# Altium footprint library CeleronLib_SMD.PcbLib: 198 footprints (part 6 of 13)
Each footprint in its own frame and in the unit in brackets; x right, y up, seen from the top. Pads: shape width x height; smd on the part's side, far side on the other; paste and mask are expansions set on the pad; w line width, h text height; cw(c..) or ccw(c..) is an arc to the next point about the centre after c.
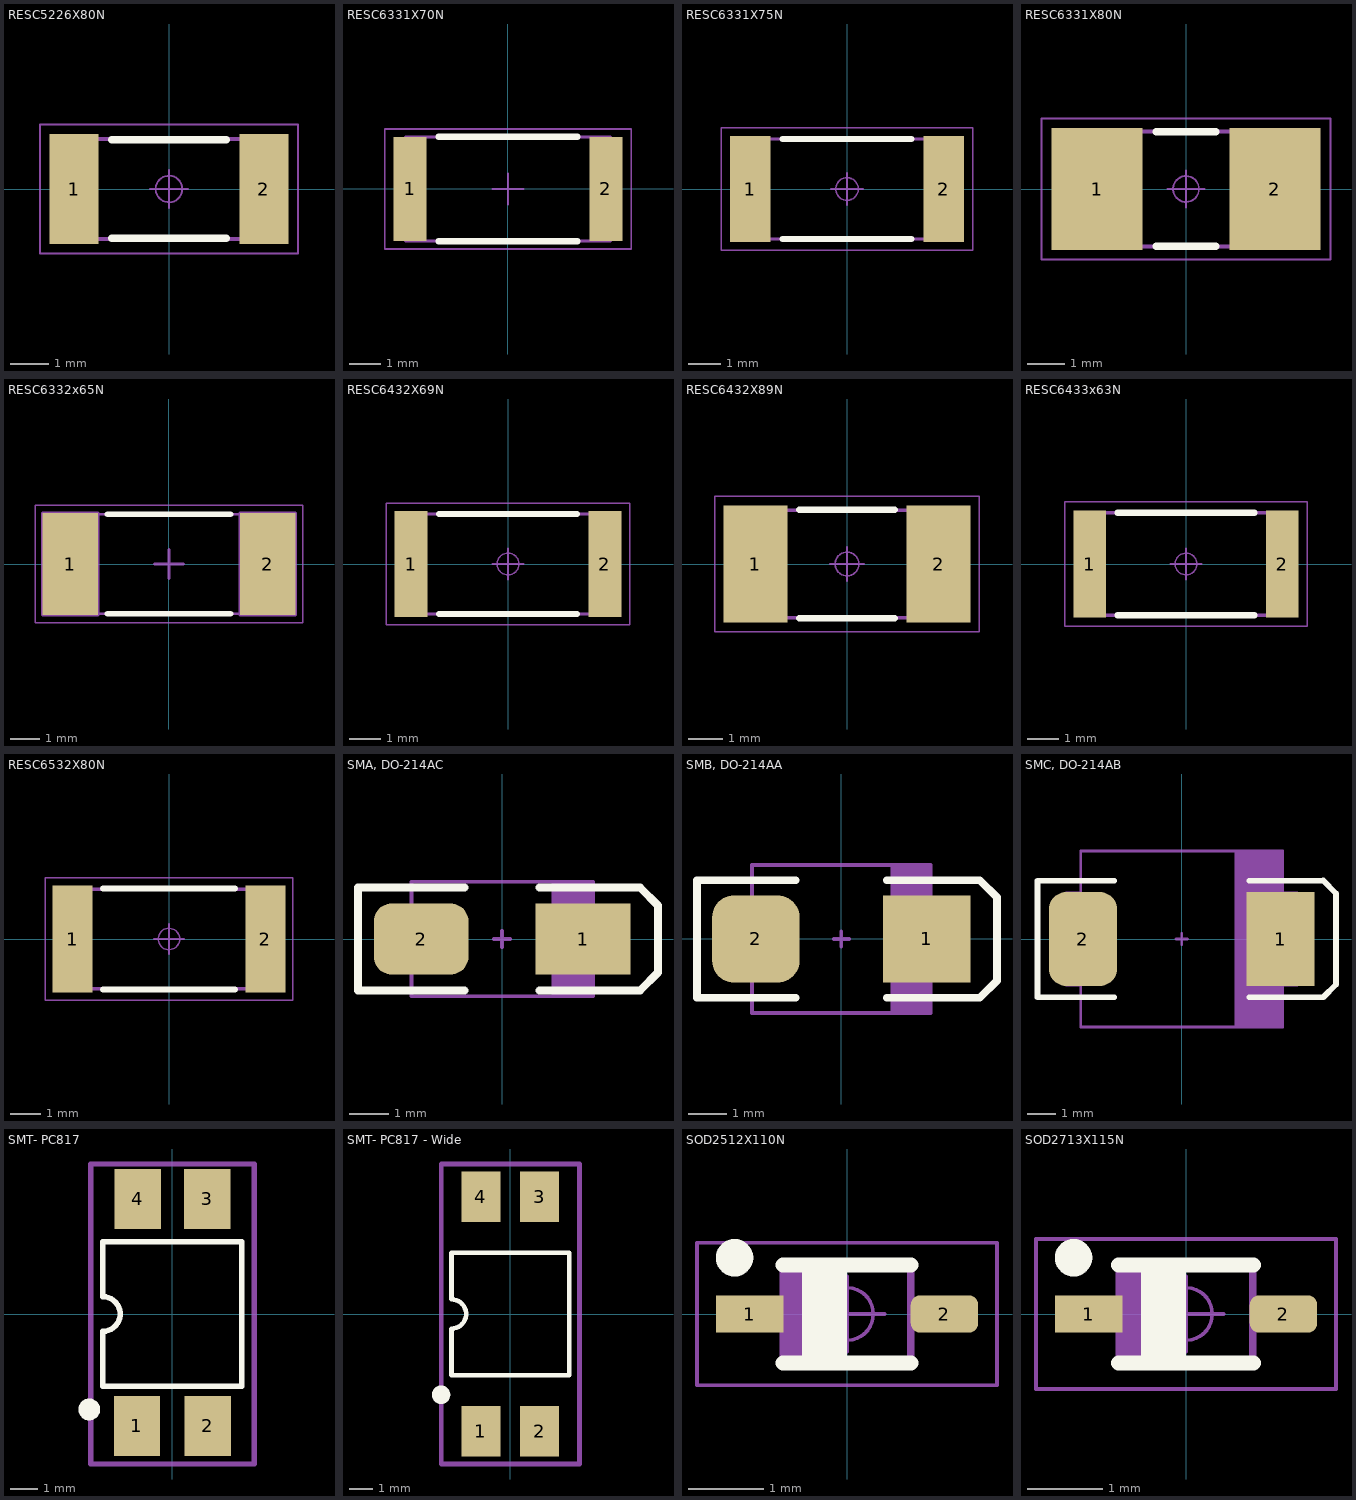
[diagram p5: the footprints below, top view; thin cyan lines are the x and y axes]

## RESC5226X80N [mm] "Resistor, Chip; 5.23mm L X 2.64mm W X 0.80mm H IPC Medium Density"
height 0.8
pads (2):
  rect 1.3x2.9 smd: 1(-2.5,0) 2(2.5,0)
Top Overlay:
  lines w0.2: -1.5,-1.3 1.5,-1.3 ; -1.5,1.3 1.5,1.3
Top Assy:
  lines w0.1: -2.615,-1.32 2.615,-1.32 2.615,1.32 -2.615,1.32 -2.615,-1.32
Top Courtyard:
  circle w0.05: c0,0 r0.35
  lines w0.05: -0.5,0 0.5,0 ; 0,-0.5 0,0.5 ; -3.4,-1.7 3.4,-1.7 3.4,1.7 -3.4,1.7 -3.4,-1.7
3D body: height 0.8, standoff 0, extent -2.615,-1.32 2.615,1.32

## RESC6331X70N [mm] "Chip Resistor, EIA 2512, Metric 6331, 2-Leads, Body 6.3x3.1mm, IPC Medium Density"
height 0.7
pads (2):
  rect 1.05x3.3 smd: 1(-3.1,0) 2(3.1,0)
Top Overlay:
  lines w0.2: -2.2,-1.65 2.2,-1.65 ; -2.2,1.65 2.2,1.65
Top Assy:
  lines w0.1: -3.25,-1.65 -3.25,1.65 3.25,1.65 3.25,-1.65 -3.25,-1.65
Top Courtyard:
  lines w0.05: -0.5,0 0.5,0 ; 0,-0.5 0,0.5 ; -3.9,-1.9 -3.9,1.9 3.9,1.9 3.9,-1.9 -3.9,-1.9
3D body: height 0.7, standoff 0, extent -3.25,-1.65 3.25,1.65

## RESC6331X75N [mm] "Chip Resistor, EIA 2512, Metric 6331, 2-Leads, Body 6.3x3.1mm, IPC Medium Density"
height 0.75
pads (2):
  rect 1.25x3.3 smd: 1(-3,0) 2(3,0)
Top Overlay:
  lines w0.2: -2,-1.55 2,-1.55 ; -2,1.55 2,1.55
Top Assy:
  lines w0.1: -3.15,-1.55 -3.15,1.55 3.15,1.55 3.15,-1.55 -3.15,-1.55
Top Courtyard:
  circle w0.05: c0,0 r0.35
  lines w0.05: -0.5,0 0.5,0 ; 0,-0.5 0,0.5 ; -3.9,-1.9 -3.9,1.9 3.9,1.9 3.9,-1.9 -3.9,-1.9
3D body: height 0.75, standoff 0, extent -3.25,-1.625 3.25,1.625

## RESC6331X80N [mm] "Chip Resistor, EIA 2512, Metric 6331, 2-Leads, Body 6.3x3.1mm, IPC Medium Density"
height 0.8
pads (2):
  rect 2.45x3.3 smd: 1(-2.4,0) 2(2.4,0)
Top Overlay:
  lines w0.2: -0.8,-1.55 0.8,-1.55 ; -0.8,1.55 0.8,1.55
Top Assy:
  lines w0.1: -3.15,-1.55 3.15,-1.55 3.15,1.55 -3.15,1.55 -3.15,-1.55
Top Courtyard:
  circle w0.05: c0,0 r0.35
  lines w0.05: -0.5,0 0.5,0 ; 0,-0.5 0,0.5 ; -3.9,-1.9 3.9,-1.9 3.9,1.9 -3.9,1.9 -3.9,-1.9
3D body: height 0.8, standoff 0, extent -3.25,-1.65 3.25,1.65

## RESC6332x65N [mm] "Chip Resistor, EIA 2512, Metric 6332, 2-Leads, Body 6.3x3.2mm, 3521 Serie"
height 0.65
pads (2):
  rect 1.9x3.5 smd: 1(-3.378,0) 2(3.378,0)
Top Overlay:
  lines w0.2: -2.1,-1.7 2.1,-1.7 ; -2.1,1.7 2.1,1.7
Mechanical 8:
  lines w0.1: -3.878,0 -3.378,0 ; -3.378,-0.5 -3.378,0 ; -3.378,0.5 -3.378,0 ; -2.878,0 -3.378,0 ; -0.5,0 0,0 ; 0,-0.5 0,0 ; 0,0.5 0,0 ; 0.5,0 0,0 ; 2.878,0 3.378,0 ; 3.378,-0.5 3.378,0 ; 3.378,0.5 3.378,0 ; 3.878,0 3.378,0 ; -4.328,-1.75 -4.328,1.75 -2.428,1.75 -2.428,-1.75 -4.328,-1.75 ; 2.428,-1.75 2.428,1.75 4.328,1.75 4.328,-1.75 2.428,-1.75
Top Assy:
  lines w0.1: -2.45,-1.7 -2.45,1.7 ; -2.1,-1.7 2.1,-1.7 ; 2.45,-1.7 2.45,1.7 ; -3.25,-1.7 -3.25,1.7 3.25,1.7 3.25,-1.7 -3.25,-1.7
Top Courtyard:
  lines w0.05: -4.578,-2 -4.578,2 4.578,2 4.578,-2 -4.578,-2
3D body: height 0.65, standoff 0, extent -3.25,-1.7 3.25,1.7

## RESC6432X69N [mm] "EIA 2512, Metric 6432, 2-Leads, Resistor, Chip; 6.35mm L X 3.20mm W X 0.69mm H, IPC Medium Density"
height 0.69
pads (2):
  rect 1.05x3.4 smd: 1(-3.1,0) 2(3.1,0)
Top Overlay:
  lines w0.2: -2.2,-1.6 2.2,-1.6 ; -2.2,1.6 2.2,1.6
Top Assy:
  lines w0.1: -3.175,-1.6 3.175,-1.6 3.175,1.6 -3.175,1.6 -3.175,-1.6
Top Courtyard:
  circle w0.05: c0,0 r0.35
  lines w0.05: -0.5,0 0.5,0 ; 0,-0.5 0,0.5 ; -3.9,-1.95 3.9,-1.95 3.9,1.95 -3.9,1.95 -3.9,-1.95
3D body: height 0.7, standoff 0, extent -3.25,-1.675 3.25,1.675

## RESC6432X89N [mm] "Resistor, Chip; 6.35mm L X 3.18mm W X 0.889mm H, IPC Medium Density"
height 0.89
pads (2):
  rect 1.9x3.45 smd: 1(-2.7,0) 2(2.7,0)
Top Overlay:
  lines w0.2: -1.4,-1.6 1.4,-1.6 ; -1.4,1.6 1.4,1.6
Top Assy:
  lines w0.1: -3.175,-1.59 3.175,-1.59 3.175,1.59 -3.175,1.59 -3.175,-1.59
Top Courtyard:
  circle w0.05: c0,0 r0.35
  lines w0.05: -0.5,0 0.5,0 ; 0,-0.5 0,0.5 ; -3.9,-2 3.9,-2 3.9,2 -3.9,2 -3.9,-2
3D body: height 0.89, standoff 0, extent -3.3,-1.715 3.3,1.715

## RESC6433x63N [mm] "EIA 2512, Metric 6433, Resistor, Chip; 6.35mm L X 3.30mm W X 0.627mm H, IPC Medium Density"
height 0.627
pads (2):
  rect 1.05x3.45 smd: 1(-3.1,0) 2(3.1,0)
Top Overlay:
  lines w0.2: -2.2,-1.65 2.2,-1.65 ; -2.2,1.65 2.2,1.65
Top Assy:
  lines w0.1: -3.175,-1.65 -3.175,1.65 3.175,1.65 3.175,-1.65 -3.175,-1.65
Top Courtyard:
  circle w0.05: c0,0 r0.35
  lines w0.05: -0.5,0 0.5,0 ; 0,-0.5 0,0.5 ; -3.9,-2 -3.9,2 3.9,2 3.9,-2 -3.9,-2
3D body: height 0.63, standoff 0, extent -3.175,-1.65 3.175,1.65

## RESC6532X80N [mm] "Resistor, Chip; 6.5mm L X 3.25mm W X 0.80mm H, IPC Medium Density"
height 0.8
pads (2):
  rect 1.3x3.5 smd: 1(-3.15,0) 2(3.15,0)
Top Overlay:
  lines w0.2: -2.15,-1.65 2.15,-1.65 ; -2.15,1.65 2.15,1.65
Top Assy:
  lines w0.1: -3.25,-1.625 -3.25,1.625 3.25,1.625 3.25,-1.625 -3.25,-1.625
Top Courtyard:
  circle w0.05: c0,0 r0.35
  lines w0.05: -0.5,0 0.5,0 ; 0,-0.5 0,0.5 ; -4.05,-2 -4.05,2 4.05,2 4.05,-2 -4.05,-2
3D body: height 0.8, standoff 0, extent -3.25,-1.625 3.25,1.625

## SMA, DO-214AC [mm] "DO-214-AC/SMA; 2 C-Bend Leads; Body 5 x 2.7 mm, inc. leads (LxW)"
height 2.44
pads (2):
  rect 2.4x1.8 smd: 1(2.05,0)
  rrect50% 2.4x1.8 smd: 2(-2.05,0)
Top Overlay:
  lines w0.2: -0.95,-1.3 -3.65,-1.3 -3.65,1.3 -0.95,1.3 ; 0.95,-1.3 3.5,-1.3 3.95,-0.85 3.95,0.85 3.5,1.3 0.95,1.3
Remarks:
  lines w0.1: -0.2,0 0.2,0 ; 0,-0.2 0,0.2
Top 3D:
  lines w0.1: -2.3,-0.8 -2.6,-0.8 -2.6,0.8 -2.3,0.8 ; 1.3,-1.45 1.3,1.45 ; 2.3,-0.8 2.6,-0.8 2.6,0.8 2.3,0.8 ; -2.3,-1.45 -2.3,1.45 2.3,1.45 2.3,-1.45 -2.3,-1.45
Top Assy:
  rectangle: 1.3,-1.45 2.3,1.45
  lines w0.1: 1.3,-1.45 1.3,1.45 ; -2.3,-1.45 2.3,-1.45 2.3,1.45 -2.3,1.45 -2.3,-1.45
3D body: height 1.22, standoff 0, extent -2.599,-0.799 -2.301,0.799
3D body: height 2.44, standoff 0, extent -2.299,-1.449 1.299,1.449
3D body: height 2.4, standoff 0, extent 1.301,-1.449 2.299,1.449
3D body: height 1.22, standoff 0, extent 2.301,-0.799 2.599,0.799
3D body: height 2.44, standoff 2.4, extent 1.301,-1.449 2.299,1.449

## SMB, DO-214AA [mm] "DO-214-AA/SMB; 2 C-Bend Leads; Body 5.3 x 3.6 mm, inc. leads (LxW)"
height 2.44
pads (2):
  rect 2.3x2.3 smd: 1(2.25,0)
  rrect50% 2.3x2.3 smd: 2(-2.25,0)
Top Overlay:
  lines w0.2: -1.2,-1.55 -3.8,-1.55 -3.8,1.55 -1.2,1.55 ; 1.2,-1.55 3.65,-1.55 4.1,-1.1 4.1,1.1 3.65,1.55 1.2,1.55
Remarks:
  lines w0.1: -0.2,0 0.2,0 ; 0,-0.2 0,0.2
Top 3D:
  lines w0.1: -2.35,-1.05 -2.8,-1.05 -2.8,1.05 -2.35,1.05 ; 1.35,-1.95 1.35,1.95 ; 2.35,-1.05 2.8,-1.05 2.8,1.05 2.35,1.05 ; -2.35,-1.95 -2.35,1.95 2.35,1.95 2.35,-1.95 -2.35,-1.95
Top Assy:
  rectangle: 1.35,-1.95 2.35,1.95
  lines w0.1: 1.35,-1.95 1.35,1.95 ; -2.35,-1.95 2.35,-1.95 2.35,1.95 -2.35,1.95 -2.35,-1.95
3D body: height 1.22, standoff 0, extent -2.8,-1.049 -2.351,1.049
3D body: height 2.44, standoff 0, extent -2.349,-1.949 1.349,1.949
3D body: height 2.4, standoff 0, extent 1.351,-1.949 2.349,1.949
3D body: height 1.22, standoff 0, extent 2.351,-1.049 2.8,1.049
3D body: height 2.44, standoff 2.4, extent 1.351,-1.949 2.349,1.949

## SMC, DO-214AB [mm] "DO-214-AB/SMC; 2 C-Bend Leads; Body 7.9 x 5.9 mm, inc. leads (LxW)"
height 2.62
pads (2):
  rect 2.4x3.3 smd: 1(3.475,0)
  rrect50% 2.4x3.3 smd: 2(-3.475,0)
Top Overlay:
  lines w0.2: -2.375,-2.05 -5.075,-2.05 -5.075,2.05 -2.375,2.05 ; 2.375,-2.05 4.975,-2.05 5.425,-1.6 5.425,1.6 4.975,2.055 ; 2.375,2.05 4.975,2.05
Remarks:
  lines w0.1: -0.2,0 0.2,0 ; 0,-0.2 0,0.2
Top 3D:
  lines w0.1: -3.55,-1.625 -4.05,-1.625 -4.05,1.625 -3.55,1.625 ; 1.9,-3.1 1.9,3.1 ; 3.55,-1.625 4.05,-1.625 4.05,1.625 3.55,1.625 ; -3.55,-3.1 3.55,-3.1 3.55,3.1 -3.55,3.1 -3.55,-3.1
Top Assy:
  rectangle: 1.9,-3.1 3.55,3.1
  lines w0.1: 1.9,-3.1 1.9,3.1 ; -3.55,-3.1 -3.55,3.1 3.55,3.1 3.55,-3.1 -3.55,-3.1
3D body: height 2.62, standoff 2.6, extent 1.901,-3.099 3.549,3.099
3D body: height 1.3, standoff 0, extent 3.551,-1.624 4.049,1.624
3D body: height 2.6, standoff 0, extent 1.901,-3.099 3.549,3.099
3D body: height 2.62, standoff 0, extent -3.549,-3.099 1.899,3.099
3D body: height 1.3, standoff 0, extent -4.049,-1.624 -3.551,1.624

## SMT- PC817 [mm] "DIP; 4 Leads; Row Spacing 8.2 mm; Pitch 2.54 mm"
height 4
pads (4):
  rect 1.7x2.2 smd: 1(-1.3,-4.1) 2(1.3,-4.1) 3(1.272,4.22) 4(-1.272,4.22)
Top Overlay:
  circle w0.4: c-3.05,-3.5 r0.2
  lines w0.2: -2.55,-2.65 -2.55,-0.635 ccw(c-2.55,0) -2.55,0.635 -2.55,2.65 2.55,2.65 2.55,-2.65 -2.55,-2.65
Top Courtyard:
  lines w0.2: -3,-5.5 3,-5.5 3,5.5 -3,5.5 -3,-5.5
3D body: height 3.85, standoff 0, extent -2.29,-5.101 2.29,4.899

## SMT- PC817 - Wide [mm] "DIP; 4 Leads; Row Spacing 8.2 mm; Pitch 2.54 mm"
height 4
pads (4):
  rect 1.7x2.2 smd: 1(-1.27,-5.08) 2(1.27,-5.08) 3(1.27,5.08) 4(-1.27,5.08)
Top Overlay:
  circle w0.4: c-3,-3.5 r0.2
  lines w0.2: -2.55,-2.65 -2.55,-0.635 ccw(c-2.55,0) -2.55,0.635 -2.55,2.65 2.55,2.65 2.55,-2.65 -2.55,-2.65
Top Courtyard:
  lines w0.2: -3,-6.5 -3,6.5 3,6.5 3,-6.5 -3,-6.5
3D body: height 3.85, standoff 0, extent -2.29,-5 2.29,5

## SOD2512X110N [mm] "Small Outline Diode Flat Lead (SOD-323), 1.70mm W X 1.25mm L X 1.10mm H body,  IPC Medium Density"
height 1.1
pads (2):
  rect 0.9x0.5 smd: 1(-1.3,0)
  rrect50% 0.9x0.5 smd: 2(1.3,0)
Top Overlay:
  circle w0.25: c-1.5,0.75 r0.125
  rectangle: -0.5,-0.65 -0.1,0.65
  lines w0.2: -0.85,-0.65 0.85,-0.65 ; -0.85,0.65 0.85,0.65 ; -0.5,-0.65 -0.5,0.65 ; -0.1,-0.65 -0.1,0.65
Top Assy:
  rectangle: -0.85,-0.625 -0.15,0.625
  lines w0.1: -0.85,-0.625 -0.85,0.625 ; -0.85,-0.625 -0.85,0.625 ; -0.85,-0.625 0.85,-0.625 0.85,0.625 -0.85,0.625
Top Courtyard:
  circle w0.05: c0,0 r0.35
  lines w0.05: -0.5,0 0.5,0 ; 0,-0.5 0,0.5 ; -2,-0.95 -2,0.95 2,0.95 2,-0.95 -2,-0.95
3D body: height 1.1, standoff 0, extent -1.35,-0.675 1.35,0.675

## SOD2713X115N [mm] "SOD-323 Diode; 1.775mm W X 1.30mm L X 1.15mm H Body, IPC Medium Density"
height 1.18
pads (2):
  rect 0.9x0.5 smd: 1(-1.3,0)
  rrect50% 0.9x0.5 smd: 2(1.3,0)
Top Overlay:
  circle w0.25: c-1.5,0.75 r0.125
  rectangle: -0.5,-0.65 -0.1,0.65
  lines w0.2: -0.9,-0.65 0.9,-0.65 ; -0.9,0.65 0.9,0.65 ; -0.5,-0.65 -0.5,0.65 ; -0.1,-0.65 -0.1,0.65
Top Assy:
  rectangle: -0.888,-0.65 -0.088,0.65
  lines w0.1: -0.888,-0.65 0.888,-0.65 0.888,0.65 -0.888,0.65 -0.888,-0.65
Top Courtyard:
  circle w0.05: c0,0 r0.35
  lines w0.05: -0.5,0 0.5,0 ; 0,-0.5 0,0.5 ; -2,-1 2,-1 2,1 -2,1 -2,-1
3D body: height 1.15, standoff 0, extent -1.425,-0.75 1.425,0.75